# Altium footprint library Atlan.PcbLib: 283 footprints (part 8 of 18)
Each footprint in its own frame and in the unit in brackets; x right, y up, seen from the top. Pads: shape width x height; smd on the part's side, far side on the other; paste and mask are expansions set on the pad; w line width, h text height; cw(c..) or ccw(c..) is an arc to the next point about the centre after c.
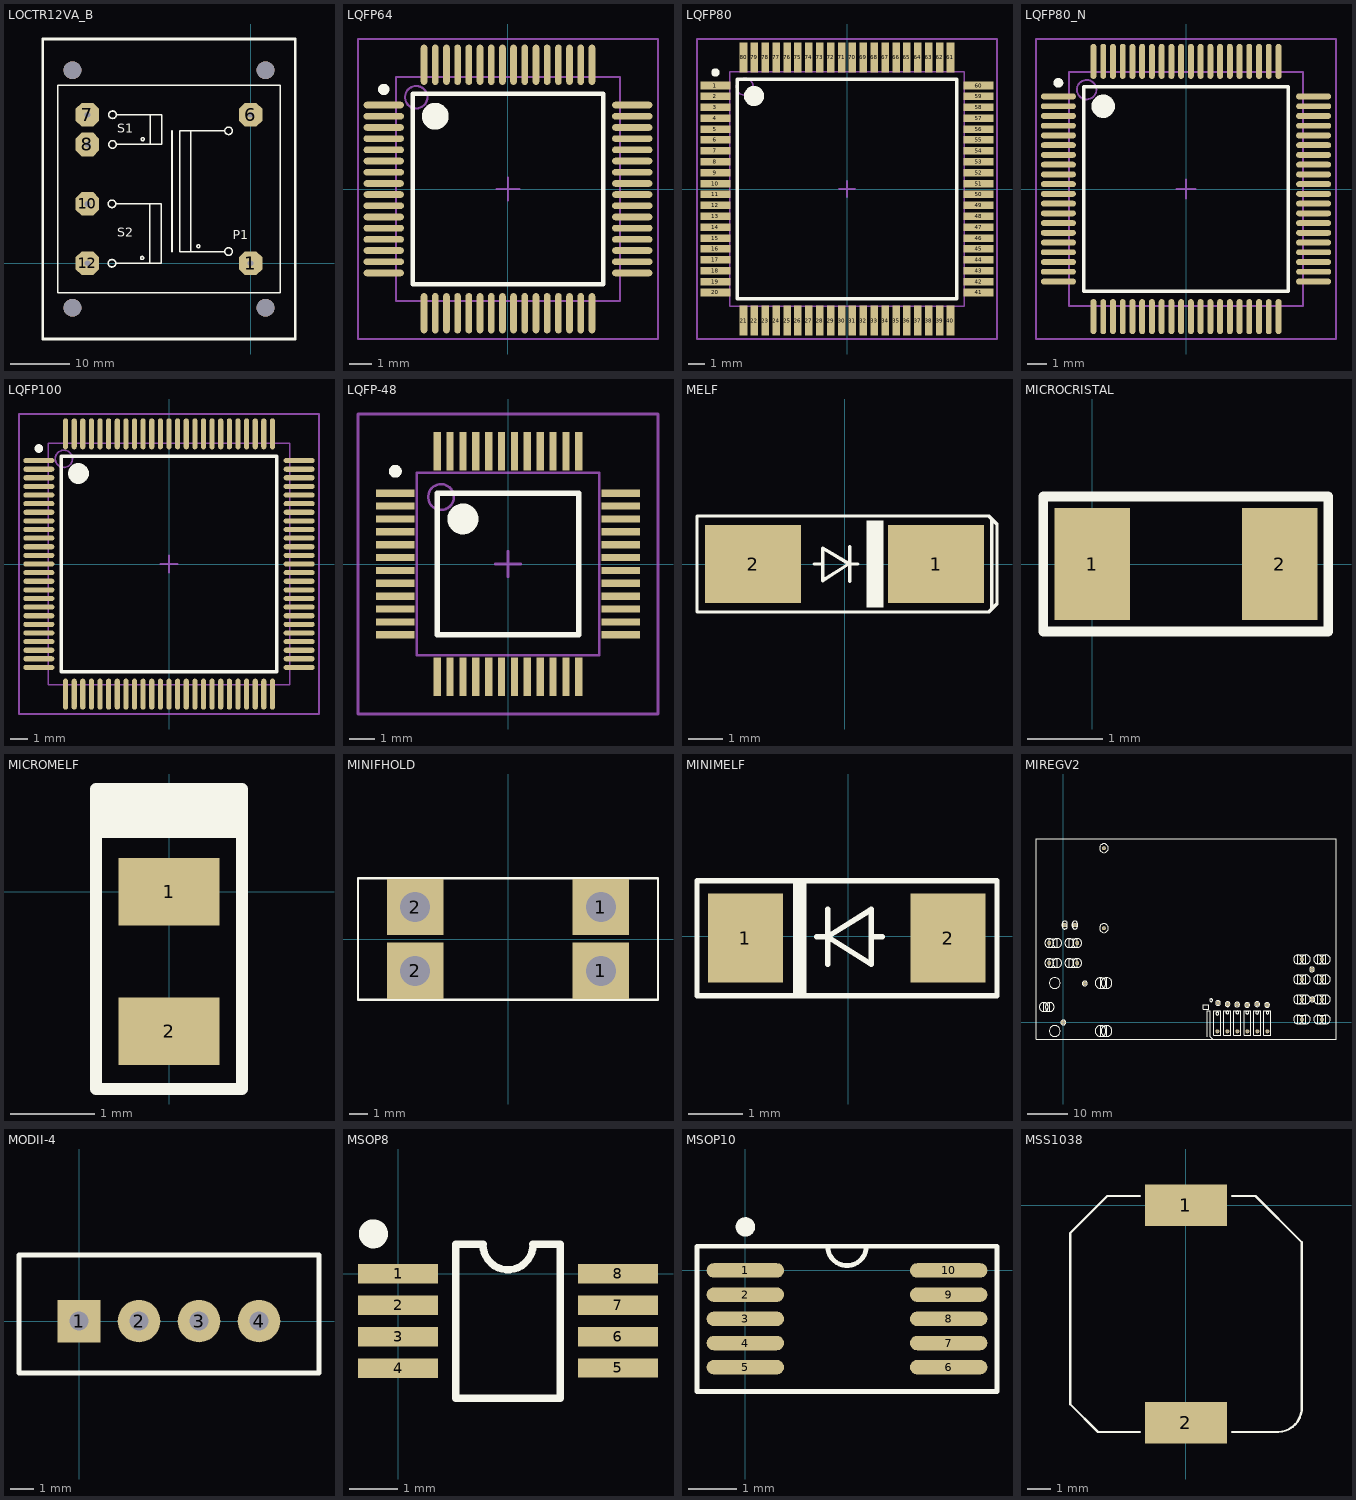
[diagram p7: the footprints below, top view; thin cyan lines are the x and y axes]

## LOCTR12VA_B [mm]
pads (10):
  oct 4x4 hole 1: 1(0,0) 6(0,25) 7(-27.5,25) 8(-27.5,20) 10(-27.5,10) 12(-27.5,0)
  round 3 hole 3 unplated: ""(-30,-7.5) ""(-30,32.5) ""(2.5,-7.5) ""(2.5,32.5)
Top Overlay:
  drawing of 425 lines, arcs and shapes, not listed
  text "S1" at -22.5,22 h1.52
  text "S2" at -22.5,4.5 h1.52
  text "P1" at -3,4 h1.52

## LQFP64 [mm] "Thin QFP, 64-Leads, Body 10x10mm, Pitch 0.5mm, IPC Medium Density"
height 1.6
pads (64):
  oval 1.8x0.3 smd: 1(-5.55,3.75) 2(-5.55,3.25) 3(-5.55,2.75) 4(-5.55,2.25) 5(-5.55,1.75) 6(-5.55,1.25) 7(-5.55,0.75) 8(-5.55,0.25) 9(-5.55,-0.25) 10(-5.55,-0.75) 11(-5.55,-1.25) 12(-5.55,-1.75) 13(-5.55,-2.25) 14(-5.55,-2.75) 15(-5.55,-3.25) 16(-5.55,-3.75) 33(5.55,-3.75) 34(5.55,-3.25) 35(5.55,-2.75) 36(5.55,-2.25) 37(5.55,-1.75) 38(5.55,-1.25) 39(5.55,-0.75) 40(5.55,-0.25) 41(5.55,0.25) 42(5.55,0.75) 43(5.55,1.25) 44(5.55,1.75) 45(5.55,2.25) 46(5.55,2.75) 47(5.55,3.25) 48(5.55,3.75)
  oval 0.3x1.8 smd: 17(-3.75,-5.55) 18(-3.25,-5.55) 19(-2.75,-5.55) 20(-2.25,-5.55) 21(-1.75,-5.55) 22(-1.25,-5.55) 23(-0.75,-5.55) 24(-0.25,-5.55) 25(0.25,-5.55) 26(0.75,-5.55) 27(1.25,-5.55) 28(1.75,-5.55) 29(2.25,-5.55) 30(2.75,-5.55) 31(3.25,-5.55) 32(3.75,-5.55) 49(3.75,5.55) 50(3.25,5.55) 51(2.75,5.55) 52(2.25,5.55) 53(1.75,5.55) 54(1.25,5.55) 55(0.75,5.55) 56(0.25,5.55) 57(-0.25,5.55) 58(-0.75,5.55) 59(-1.25,5.55) 60(-1.75,5.55) 61(-2.25,5.55) 62(-2.75,5.55) 63(-3.25,5.55) 64(-3.75,5.55)
Top Overlay:
  circle w0.6: c-3.25,3.25 r0.3
  circle w0.25: c-5.55,4.45 r0.125
  lines w0.2: -4.25,-4.25 4.25,-4.25 4.25,4.25 -4.25,4.25 -4.25,-4.25
Mechanical 13:
  circle w0.1: c-4.1,4.1 r0.5
  lines w0.1: -5,-5 5,-5 5,5 -5,5 -5,-5
Mechanical 15:
  lines w0.1: -0.5,0 0.5,0 ; 0,-0.5 0,0.5 ; -6.7,-6.7 6.7,-6.7 6.7,6.7 -6.7,6.7 -6.7,-6.7
3D body: height 1.6, standoff 0, extent -5,-5 5,5

## LQFP80 [mm] "80-Pin Thin Quad Flat Pack 0.65 mm Pitch, IPC Medium Density"
height 1.6
pads (80):
  rect 1.8x0.45 smd mask+0.05: 1(-7.85,6.175) 2(-7.85,5.525) 3(-7.85,4.875) 4(-7.85,4.225) 5(-7.85,3.575) 6(-7.85,2.925) 7(-7.85,2.275) 8(-7.85,1.625) 9(-7.85,0.975) 10(-7.85,0.325) 11(-7.85,-0.325) 12(-7.85,-0.975) 13(-7.85,-1.625) 14(-7.85,-2.275) 15(-7.85,-2.925) 16(-7.85,-3.575) 17(-7.85,-4.225) 18(-7.85,-4.875) 19(-7.85,-5.525) 20(-7.85,-6.175) 41(7.85,-6.175) 42(7.85,-5.525) 43(7.85,-4.875) 44(7.85,-4.225) 45(7.85,-3.575) 46(7.85,-2.925) 47(7.85,-2.275) 48(7.85,-1.625) 49(7.85,-0.975) 50(7.85,-0.325) 51(7.85,0.325) 52(7.85,0.975) 53(7.85,1.625) 54(7.85,2.275) 55(7.85,2.925) 56(7.85,3.575) 57(7.85,4.225) 58(7.85,4.875) 59(7.85,5.525) 60(7.85,6.175)
  rect 0.45x1.8 smd mask+0.05: 21(-6.175,-7.85) 22(-5.525,-7.85) 23(-4.875,-7.85) 24(-4.225,-7.85) 25(-3.575,-7.85) 26(-2.925,-7.85) 27(-2.275,-7.85) 28(-1.625,-7.85) 29(-0.975,-7.85) 30(-0.325,-7.85) 31(0.325,-7.85) 32(0.975,-7.85) 33(1.625,-7.85) 34(2.275,-7.85) 35(2.925,-7.85) 36(3.575,-7.85) 37(4.225,-7.85) 38(4.875,-7.85) 39(5.525,-7.85) 40(6.175,-7.85) 61(6.175,7.85) 62(5.525,7.85) 63(4.875,7.85) 64(4.225,7.85) 65(3.575,7.85) 66(2.925,7.85) 67(2.275,7.85) 68(1.625,7.85) 69(0.975,7.85) 70(0.325,7.85) 71(-0.325,7.85) 72(-0.975,7.85) 73(-1.625,7.85) 74(-2.275,7.85) 75(-2.925,7.85) 76(-3.575,7.85) 77(-4.225,7.85) 78(-4.875,7.85) 79(-5.525,7.85) 80(-6.175,7.85)
Top Overlay:
  circle w0.25: c-7.85,6.95 r0.125
  circle w0.6: c-5.55,5.55 r0.3
  lines w0.2: -6.55,-6.55 -6.55,6.55 6.55,6.55 6.55,-6.55 -6.55,-6.55
Mechanical 13:
  circle w0.1: c-6.1,6.1 r0.5
  lines w0.1: -7,-7 -7,7 7,7 7,-7 -7,-7
Mechanical 15:
  lines w0.1: -0.5,0 0.5,0 ; 0,-0.5 0,0.5 ; -8.95,-8.95 -8.95,8.95 8.95,8.95 8.95,-8.95 -8.95,-8.95
3D body: height 1.6, standoff 0, extent -7,-7 7,7

## LQFP80_N [mm] "Thin QFP, 80-Leads, Body 12x12mm, Pitch 0.5mm, IPC Medium Density"
height 1.6
pads (80):
  oval 1.8x0.3 smd: 1(-6.55,4.75) 2(-6.55,4.25) 3(-6.55,3.75) 4(-6.55,3.25) 5(-6.55,2.75) 6(-6.55,2.25) 7(-6.55,1.75) 8(-6.55,1.25) 9(-6.55,0.75) 10(-6.55,0.25) 11(-6.55,-0.25) 12(-6.55,-0.75) 13(-6.55,-1.25) 14(-6.55,-1.75) 15(-6.55,-2.25) 16(-6.55,-2.75) 17(-6.55,-3.25) 18(-6.55,-3.75) 19(-6.55,-4.25) 20(-6.55,-4.75) 41(6.55,-4.75) 42(6.55,-4.25) 43(6.55,-3.75) 44(6.55,-3.25) 45(6.55,-2.75) 46(6.55,-2.25) 47(6.55,-1.75) 48(6.55,-1.25) 49(6.55,-0.75) 50(6.55,-0.25) 51(6.55,0.25) 52(6.55,0.75) 53(6.55,1.25) 54(6.55,1.75) 55(6.55,2.25) 56(6.55,2.75) 57(6.55,3.25) 58(6.55,3.75) 59(6.55,4.25) 60(6.55,4.75)
  oval 0.3x1.8 smd: 21(-4.75,-6.55) 22(-4.25,-6.55) 23(-3.75,-6.55) 24(-3.25,-6.55) 25(-2.75,-6.55) 26(-2.25,-6.55) 27(-1.75,-6.55) 28(-1.25,-6.55) 29(-0.75,-6.55) 30(-0.25,-6.55) 31(0.25,-6.55) 32(0.75,-6.55) 33(1.25,-6.55) 34(1.75,-6.55) 35(2.25,-6.55) 36(2.75,-6.55) 37(3.25,-6.55) 38(3.75,-6.55) 39(4.25,-6.55) 40(4.75,-6.55) 61(4.75,6.55) 62(4.25,6.55) 63(3.75,6.55) 64(3.25,6.55) 65(2.75,6.55) 66(2.25,6.55) 67(1.75,6.55) 68(1.25,6.55) 69(0.75,6.55) 70(0.25,6.55) 71(-0.25,6.55) 72(-0.75,6.55) 73(-1.25,6.55) 74(-1.75,6.55) 75(-2.25,6.55) 76(-2.75,6.55) 77(-3.25,6.55) 78(-3.75,6.55) 79(-4.25,6.55) 80(-4.75,6.55)
Top Overlay:
  circle w0.6: c-4.25,4.25 r0.3
  circle w0.25: c-6.55,5.45 r0.125
  lines w0.2: -5.25,-5.25 5.25,-5.25 5.25,5.25 -5.25,5.25 -5.25,-5.25
Mechanical 13:
  circle w0.1: c-5.1,5.1 r0.5
  lines w0.1: -6,-6 6,-6 6,6 -6,6 -6,-6
Mechanical 15:
  lines w0.1: -0.5,0 0.5,0 ; 0,-0.5 0,0.5 ; -7.7,-7.7 7.7,-7.7 7.7,7.7 -7.7,7.7 -7.7,-7.7
3D body: height 1.6, standoff 0, extent -6,-6 6,6

## LQFP100 [mm] "Thin QFP, 100-Leads, Body 14x14mm, Pitch 0.5mm, IPC Medium Density"
height 1.6
pads (100):
  oval 1.8x0.3 smd: 1(-7.55,6) 2(-7.55,5.5) 3(-7.55,5) 4(-7.55,4.5) 5(-7.55,4) 6(-7.55,3.5) 7(-7.55,3) 8(-7.55,2.5) 9(-7.55,2) 10(-7.55,1.5) 11(-7.55,1) 12(-7.55,0.5) 13(-7.55,0) 14(-7.55,-0.5) 15(-7.55,-1) 16(-7.55,-1.5) 17(-7.55,-2) 18(-7.55,-2.5) 19(-7.55,-3) 20(-7.55,-3.5) 21(-7.55,-4) 22(-7.55,-4.5) 23(-7.55,-5) 24(-7.55,-5.5) 25(-7.55,-6) 51(7.55,-6) 52(7.55,-5.5) 53(7.55,-5) 54(7.55,-4.5) 55(7.55,-4) 56(7.55,-3.5) 57(7.55,-3) 58(7.55,-2.5) 59(7.55,-2) 60(7.55,-1.5) 61(7.55,-1) 62(7.55,-0.5) 63(7.55,0) 64(7.55,0.5) 65(7.55,1) 66(7.55,1.5) 67(7.55,2) 68(7.55,2.5) 69(7.55,3) 70(7.55,3.5) 71(7.55,4) 72(7.55,4.5) 73(7.55,5) 74(7.55,5.5) 75(7.55,6)
  oval 0.3x1.8 smd: 26(-6,-7.55) 27(-5.5,-7.55) 28(-5,-7.55) 29(-4.5,-7.55) 30(-4,-7.55) 31(-3.5,-7.55) 32(-3,-7.55) 33(-2.5,-7.55) 34(-2,-7.55) 35(-1.5,-7.55) 36(-1,-7.55) 37(-0.5,-7.55) 38(0,-7.55) 39(0.5,-7.55) 40(1,-7.55) 41(1.5,-7.55) 42(2,-7.55) 43(2.5,-7.55) 44(3,-7.55) 45(3.5,-7.55) 46(4,-7.55) 47(4.5,-7.55) 48(5,-7.55) 49(5.5,-7.55) 50(6,-7.55) 76(6,7.55) 77(5.5,7.55) 78(5,7.55) 79(4.5,7.55) 80(4,7.55) 81(3.5,7.55) 82(3,7.55) 83(2.5,7.55) 84(2,7.55) 85(1.5,7.55) 86(1,7.55) 87(0.5,7.55) 88(0,7.55) 89(-0.5,7.55) 90(-1,7.55) 91(-1.5,7.55) 92(-2,7.55) 93(-2.5,7.55) 94(-3,7.55) 95(-3.5,7.55) 96(-4,7.55) 97(-4.5,7.55) 98(-5,7.55) 99(-5.5,7.55) 100(-6,7.55)
Top Overlay:
  circle w0.25: c-7.55,6.7 r0.125
  circle w0.6: c-5.25,5.25 r0.3
  lines w0.2: -6.25,-6.25 -6.25,6.25 6.25,6.25 6.25,-6.25 -6.25,-6.25
Mechanical 13:
  circle w0.1: c-6.1,6.1 r0.5
  lines w0.1: -7,-7 -7,7 7,7 7,-7 -7,-7
Mechanical 15:
  lines w0.1: -0.5,0 0.5,0 ; 0,-0.5 0,0.5 ; -8.7,-8.7 -8.7,8.7 8.7,8.7 8.7,-8.7 -8.7,-8.7
3D body: height 1.6, standoff 0, extent -7,-7 7,7

## LQFP-48 [mm] "TSQFP, 48-Leads, Body 10,4x10,4mm (max), Pitch 0,50mm, IPC Medium Density"
height 1.6
pads (48):
  rect 1.5x0.28 smd: 1(-4.375,2.75) 2(-4.375,2.25) 3(-4.375,1.75) 4(-4.375,1.25) 5(-4.375,0.75) 6(-4.375,0.25) 7(-4.375,-0.25) 8(-4.375,-0.75) 9(-4.375,-1.25) 10(-4.375,-1.75) 11(-4.375,-2.25) 12(-4.375,-2.75) 25(4.375,-2.75) 26(4.375,-2.25) 27(4.375,-1.75) 28(4.375,-1.25) 29(4.375,-0.75) 30(4.375,-0.25) 31(4.375,0.25) 32(4.375,0.75) 33(4.375,1.25) 34(4.375,1.75) 35(4.375,2.25) 36(4.375,2.75)
  rect 0.28x1.5 smd: 13(-2.75,-4.375) 14(-2.25,-4.375) 15(-1.75,-4.375) 16(-1.25,-4.375) 17(-0.75,-4.375) 18(-0.25,-4.375) 19(0.25,-4.375) 20(0.75,-4.375) 21(1.25,-4.375) 22(1.75,-4.375) 23(2.25,-4.375) 24(2.75,-4.375) 37(2.75,4.375) 38(2.25,4.375) 39(1.75,4.375) 40(1.25,4.375) 41(0.75,4.375) 42(0.25,4.375) 43(-0.25,4.375) 44(-0.75,4.375) 45(-1.25,4.375) 46(-1.75,4.375) 47(-2.25,4.375) 48(-2.75,4.375)
Top Overlay:
  circle w0.6: c-1.75,1.75 r0.3
  circle w0.25: c-4.375,3.6 r0.125
  lines w0.2: -2.75,-2.75 2.75,-2.75 2.75,2.75 -2.75,2.75 -2.75,-2.75
Mechanical 13:
  circle w0.1: c-2.6,2.6 r0.5
  lines w0.1: -3.55,-3.55 3.55,-3.55 3.55,3.55 -3.55,3.55 -3.55,-3.55
Mechanical 15:
  lines w0.1: -0.5,0 0.5,0 ; 0,-0.5 0,0.5 ; -5.825,-5.825 5.825,-5.825 5.825,5.825 -5.825,5.825 -5.825,-5.825
3D body "User Library-sot313-2.STEP": height 1.42, standoff -0.12, extent -4.503,-4.5 4.503,4.506

## MELF [mil]
height 118.11
pads (2):
  rect 110x90 smd: 1(105,0) 2(-105,0)
Top Overlay:
  rectangle: 25,-50 45,50
  lines w3.94: -35,0 -25,0 ; 6,-20 6,20 ; 15,0 5.18,0.29 ; 168.94,-50 168.94,50 ; 5.18,0.29 -25,-19 -25,18.4 5.18,0.29 ; -169.29,-55.12 165.35,-55.12 175,-45.47 175,45.47 165.35,55.12 -169.29,55.12 -169.29,-55.12
3D body "User Library-MELF.STEP": height 98.43, standoff 0, extent -88.43,-48.43 108.42,50

## MICROCRISTAL [mm]
pads (2):
  rect 1x1.5 smd: 1(0,0) 2(2.5,0)
Top Overlay:
  lines w0.127: -0.655,-0.9 3.145,-0.9 3.145,0.9 -0.655,0.9 -0.655,-0.9

## MICROMELF [mm] "Diode"
pads (2):
  rect 1.2x0.8 smd: 1(0,0) 2(0,-1.651)
Top Overlay:
  lines w0.14: -0.864,0.711 0.864,0.711 ; -0.864,0.813 0.864,0.813 ; -0.864,0.914 0.864,0.914 ; -0.864,1.016 0.864,1.016 ; -0.864,1.118 0.864,1.118 ; -0.864,-2.337 -0.864,1.219 0.864,1.219 0.864,-2.337 -0.864,-2.337

## MINIFHOLD [mm] "Mini fuse holder"
pads (4):
  rect 3x3 hole 1.6: 1(4.95,-1.7) 1(4.95,1.7) 2(-4.95,-1.7) 2(-4.95,1.7)
Top Overlay:
  lines w0.127: -8,-3.25 -8,3.25 8,3.25 8,-3.25 -8,-3.25
3D body: height 7.4, standoff 0, extent -8,-3.3 8,3.3
3D body: height 17.4, standoff 7.4, extent -4.95,-1.7 4.95,1.7

## MINIMELF [mil]
height 78.74
pads (2):
  rect 54x64 smd: 1(-74.18,-1.5) 2(71.82,-1.5)
Top Overlay:
  rectangle: -40,-44 -30,39.84
  lines w3.94: -22.87,-0.5 -15,-0.5 ; -15,-20.18 -15,19.19 ; 16.5,-0.5 24.37,-0.5 ; -15,-0.5 16.5,-20.18 16.5,19.19 -15,-0.5 ; -109,-42.83 107,-42.83 107,39.84 -109,39.84 -109,-42.83
3D body "User Library-MiniMelf-2.STEP": height 62.99, standoff 0, extent -74.01,-31.49 71.66,31.5

## MIREGV2 [mm]
pads (32):
  round 1 hole 0.5 unplated: 0(-3.538,14.859) 0(-3.538,19.863) 0(0,0) 0(0.356,24.359) 0(2.896,24.359) 0(3.462,14.859) 0(3.462,19.863) 0(5.359,9.754) 0(10.16,23.571) 0(10.16,43.561) 0(38.506,-2.229) 0(38.659,4.851) 0(41.006,-2.229) 0(41.072,4.572) 0(43.459,4.47) 0(43.506,-2.229) 0(45.974,4.369) 0(46.006,-2.229) 0(48.463,4.572) 0(48.506,-2.229) 0(50.952,4.369) 0(51.006,-2.229) 0(59.665,0.762) 0(59.665,5.766) 0(59.665,10.77) 0(59.665,15.773) 0(62.154,13.259) 0(62.255,5.766) 0(64.668,0.762) 0(64.668,5.766) 0(64.668,10.77) 0(64.668,15.773)
Top Overlay:
  drawing of 302 lines, arcs and shapes, not listed

## MODII-4 [mm]
pads (4):
  rect 1.8x1.8 hole 0.8: 1(0,0)
  round 1.8 hole 0.8: 2(2.54,0) 3(5.08,0) 4(7.62,0)
Top Overlay:
  lines w0.203: -2.54,-2.2 -2.54,2.8 10.16,2.8 10.16,-2.2 -2.54,-2.2

## MSOP8 [mm]
pads (8):
  rect 1.65x0.4 smd: 1(0,0) 2(0,-0.65) 3(0,-1.3) 4(0,-1.95) 5(4.534,-1.942) 6(4.534,-1.3) 7(4.534,-0.65) 8(4.534,0)
Top Overlay:
  circle w0.3: c-0.508,0.823 r0.15
  lines w0.15: 1.75,0.6 ccw(c2.267,0.6) 2.784,0.6 ; 1.759,0.609 1.188,0.609 1.188,-2.566 3.347,-2.566 3.347,0.609 2.775,0.609
3D body "MSOP-8.step": height 1.1, standoff 0, extent -0.202,-2.528 4.736,0.572

## MSOP10 [mm]
pads (10):
  oval 1.6x0.3 smd mask+0.05: 1(0,0) 2(0,-0.5) 3(0,-1) 4(0,-1.5) 5(0,-2) 6(4.2,-2) 7(4.2,-1.5) 8(4.2,-1) 9(4.2,-0.5) 10(4.2,0)
Top Overlay:
  circle w0.2: c0,0.9 r0.1
  lines w0.1: 1.7,0.5 ccw(c2.1,0.5) 2.5,0.5 ; -1,-2.5 -1,0.5 5.2,0.5 5.2,-2.5 -1,-2.5
3D body: height 0.7, standoff 0, extent 0.9,-2.5 3.3,0.5

## MSS1038 [mm]
height 3.8
pads (2):
  rect 3.56x1.78 smd: 1(0,0) 2(0,-9.4)
Top Overlay:
  lines w0.1: -2,-9.8 -3.8,-9.8 -5,-8.6 -5,-1.2 ; -2,0.4 -3.4,0.4 ; 2,-9.8 4,-9.8 ccw(c3.95,-8.75) 5,-8.7 5,-1.6 ; 2,0.4 3,0.4 ; -5,-1.2 -3.4,0.4 ; -5,-1.2 -3.4,0.4 ; 3,0.4 5,-1.6 ; 3,0.4 5,-1.6
3D body: height 3.8, standoff 0, extent -5,-9.8 5,0.4